# Altium schematic symbol library Capacitor - Aluminium TH.SchLib: 4591 symbols (part 13 of 27) (continued)
## ELZA160ELL222MK20S (continued)
CAP ALUM 2200UF 20% 16V RADIAL; Part Number: ELZA160ELL222MK20S; Manufacturer: United Chemi-Con; TemperatureRange: -55C ~ 105C; Type: Polar; Ripple Current: 1.418A @ 120Hz; Impedance: 29 mOhm; Value: 2200uF; PartId: 23072; Supplier 1: Digi-Key; Supplier Part Number 1: 565-3368-ND; ComponentLink1Description: Datasheet; ComponentLink1URL: http://www.chemi-con.co.jp/cgi-bin/CAT_DB/SEARCH/cat_db_al.cgi?e=e&j=p&pdfname=lza; ComponentLink2Description: Digi-Key Listing; ComponentLink2URL: https://www.digikey.com/product-detail/en/united-chemi-con/ELZA160ELL222MK20S/565-3368-ND/3529537; Tolerance: 20%; Voltage: 16V; Price: 0; Device Package: Radial, Can, 12.5mm
footprint CAP AL TH D12.5 L5 H21.5
pins: 1, 2

## ELZA160ELL332MK25S
designator C?, comment 3300uF  (value not drawn)
CAP ALUM 3300UF 20% 16V RADIAL; Part Number: ELZA160ELL332MK25S; Manufacturer: United Chemi-Con; TemperatureRange: -55C ~ 105C; Type: Polar; Ripple Current: 1.763A @ 120Hz; Impedance: 22 mOhm; Value: 3300uF; PartId: 23742; Supplier 1: Digi-Key; Supplier Part Number 1: 565-3610-ND; ComponentLink1Description: Datasheet; ComponentLink1URL: http://www.chemi-con.co.jp/cgi-bin/CAT_DB/SEARCH/cat_db_al.cgi?e=e&j=p&pdfname=lza; ComponentLink2Description: Digi-Key Listing; ComponentLink2URL: https://www.digikey.com/product-detail/en/united-chemi-con/ELZA160ELL332MK25S/565-3610-ND/3529411; Tolerance: 20%; Voltage: 16V; Price: 1.6; Device Package: Radial, Can, 12.5mm
footprint CAP AL TH D12.5 L5 H26.5
pins: 1, 2

## ELZA250ELL122MJ25S
designator C?, comment 1200uF  (value not drawn)
CAP ALUM 1200UF 20% 25V RADIAL; Part Number: ELZA250ELL122MJ25S; Manufacturer: United Chemi-Con; TemperatureRange: -55C ~ 105C; Type: Polar; Ripple Current: 1.044A @ 120Hz; Impedance: 33 mOhm; Value: 1200uF; PartId: 26203; Supplier 1: Digi-Key; Supplier Part Number 1: 565-3369-ND; ComponentLink1Description: Datasheet; ComponentLink1URL: http://www.chemi-con.co.jp/cgi-bin/CAT_DB/SEARCH/cat_db_al.cgi?e=e&j=p&pdfname=lza; ComponentLink2Description: Digi-Key Listing; ComponentLink2URL: https://www.digikey.com/product-detail/en/united-chemi-con/ELZA250ELL122MJ25S/565-3369-ND/3529540; Tolerance: 20%; Voltage: 25V; Price: 1.78; Device Package: Radial, Can, 10mm
footprint CAP AL TH D10 L5 H30
pins: 1, 2

## ELZA250ELL222MK25S
designator C?, comment 2200uF  (value not drawn)
CAP ALUM 2200UF 20% 25V RADIAL; Part Number: ELZA250ELL222MK25S; Manufacturer: United Chemi-Con; TemperatureRange: -55C ~ 105C; Type: Polar; Ripple Current: 1.763A @ 120Hz; Impedance: 22 mOhm; Value: 2200uF; PartId: 23744; Supplier 1: Digi-Key; Supplier Part Number 1: 565-3611-ND; ComponentLink1Description: Datasheet; ComponentLink1URL: http://www.chemi-con.co.jp/cgi-bin/CAT_DB/SEARCH/cat_db_al.cgi?e=e&j=p&pdfname=lza; ComponentLink2Description: Digi-Key Listing; ComponentLink2URL: https://www.digikey.com/product-detail/en/united-chemi-con/ELZA250ELL222MK25S/565-3611-ND/3529412; Tolerance: 20%; Voltage: 25V; Price: 1.62; Device Package: Radial, Can, 12.5mm
footprint CAP AL TH D12.5 L5 H26.5
pins: 1, 2

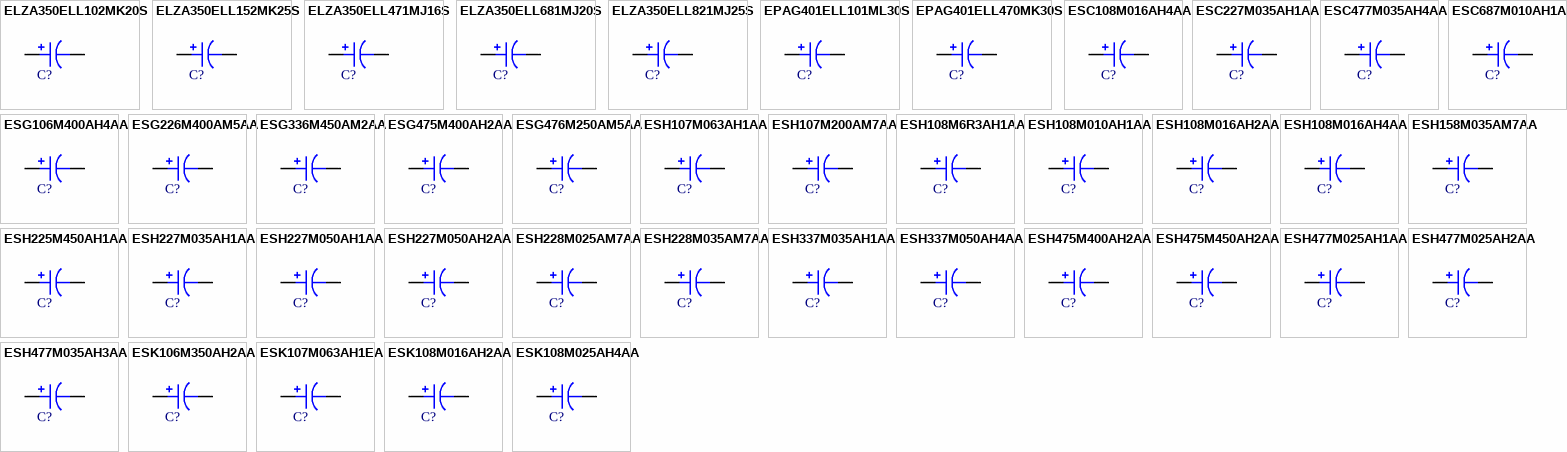
[diagram p53: symbols ELZA350ELL102MK20S to ESK108M025AH4AA]

## ELZA350ELL102MK20S
designator C?, comment 1000uF  (value not drawn)
CAP ALUM 1000UF 20% 35V RADIAL; Part Number: ELZA350ELL102MK20S; Manufacturer: United Chemi-Con; TemperatureRange: -55C ~ 105C; Type: Polar; Ripple Current: 1.134A @ 120Hz; Impedance: 29 mOhm; Value: 1000uF; PartId: 23075; Supplier 1: Digi-Key; Supplier Part Number 1: 565-3373-ND; ComponentLink1Description: Datasheet; ComponentLink1URL: http://www.chemi-con.co.jp/cgi-bin/CAT_DB/SEARCH/cat_db_al.cgi?e=e&j=p&pdfname=lza; ComponentLink2Description: Digi-Key Listing; ComponentLink2URL: https://www.digikey.com/product-detail/en/united-chemi-con/ELZA350ELL102MK20S/565-3373-ND/3529544; Tolerance: 20%; Voltage: 35V; Price: 0; Device Package: Radial, Can, 12.5mm
footprint CAP AL TH D12.5 L5 H21.5
pins: 1, 2

## ELZA350ELL152MK25S
designator C?, comment 1500uF  (value not drawn)
CAP ALUM 1500UF 20% 35V RADIAL; Part Number: ELZA350ELL152MK25S; Manufacturer: United Chemi-Con; TemperatureRange: -55C ~ 105C; Type: Polar; Ripple Current: 1.41A @ 120Hz; Impedance: 22 mOhm; Value: 1500uF; PartId: 23775; Supplier 1: Digi-Key; Supplier Part Number 1: 565-3374-ND; ComponentLink1Description: Datasheet; ComponentLink1URL: http://www.chemi-con.co.jp/cgi-bin/CAT_DB/SEARCH/cat_db_al.cgi?e=e&j=p&pdfname=lza; ComponentLink2Description: Digi-Key Listing; ComponentLink2URL: https://www.digikey.com/product-detail/en/united-chemi-con/ELZA350ELL152MK25S/565-3374-ND/3641511; Tolerance: 20%; Voltage: 35V; Price: 2.25; Device Package: Radial, Can, 12.5mm
footprint CAP AL TH D12.5 L5 H26.5
pins: 1, 2

## ELZA350ELL471MJ16S
designator C?, comment 470uF  (value not drawn)
CAP ALUM 470UF 20% 35V RADIAL; Part Number: ELZA350ELL471MJ16S; Manufacturer: United Chemi-Con; TemperatureRange: -55C ~ 105C; Type: Polar; Ripple Current: 620mA @ 120Hz; Impedance: 49 mOhm; Value: 470uF; PartId: 25438; Supplier 1: Digi-Key; Supplier Part Number 1: 565-3371-ND; ComponentLink1Description: Datasheet; ComponentLink1URL: http://www.chemi-con.co.jp/cgi-bin/CAT_DB/SEARCH/cat_db_al.cgi?e=e&j=p&pdfname=lza; ComponentLink2Description: Digi-Key Listing; ComponentLink2URL: https://www.digikey.com/product-detail/en/united-chemi-con/ELZA350ELL471MJ16S/565-3371-ND/3529547; Tolerance: 20%; Voltage: 35V; Price: 1.36; Device Package: Radial, Can, 10mm
footprint CAP AL TH D10 L5 H17.5
pins: 1, 2

## ELZA350ELL681MJ20S
designator C?, comment 680uF  (value not drawn)
CAP ALUM 680UF 20% 35V RADIAL; Part Number: ELZA350ELL681MJ20S; Manufacturer: United Chemi-Con; TemperatureRange: -55C ~ 105C; Type: Polar; Ripple Current: 930mA @ 120Hz; Impedance: 35 mOhm; Value: 680uF; PartId: 25720; Supplier 1: Digi-Key; Supplier Part Number 1: 565-3372-ND; ComponentLink1Description: Datasheet; ComponentLink1URL: http://www.chemi-con.co.jp/cgi-bin/CAT_DB/SEARCH/cat_db_al.cgi?e=e&j=p&pdfname=lza; ComponentLink2Description: Digi-Key Listing; ComponentLink2URL: https://www.digikey.com/product-detail/en/united-chemi-con/ELZA350ELL681MJ20S/565-3372-ND/3529548; Tolerance: 20%; Voltage: 35V; Price: 1.57; Device Package: Radial, Can, 10mm
footprint CAP AL TH D10 L5 H22
pins: 1, 2

## ELZA350ELL821MJ25S
designator C?, comment 820uF  (value not drawn)
CAP ALUM 820UF 20% 35V RADIAL; Part Number: ELZA350ELL821MJ25S; Manufacturer: United Chemi-Con; TemperatureRange: -55C ~ 105C; Type: Polar; Ripple Current: 1.044A @ 120Hz; Impedance: 33 mOhm; Value: 820uF; PartId: 26190; Supplier 1: Digi-Key; Supplier Part Number 1: 565-3612-ND; ComponentLink1Description: Datasheet; ComponentLink1URL: http://www.chemi-con.co.jp/cgi-bin/CAT_DB/SEARCH/cat_db_al.cgi?e=e&j=p&pdfname=lza; ComponentLink2Description: Digi-Key Listing; ComponentLink2URL: https://www.digikey.com/product-detail/en/united-chemi-con/ELZA350ELL821MJ25S/565-3612-ND/3529413; Tolerance: 20%; Voltage: 35V; Price: 1.17; Device Package: Radial, Can, 10mm
footprint CAP AL TH D10 L5 H30
pins: 1, 2

## EPAG401ELL101ML30S
designator C?, comment 100uF  (value not drawn)
CAP ALUM 100UF 20% 400V RADIAL; Part Number: EPAG401ELL101ML30S; Manufacturer: United Chemi-Con; TemperatureRange: -40C ~ 105C; Type: Polar; Ripple Current: 580mA @ 120Hz; Value: 100uF; PartId: 27277; Supplier 1: Digi-Key; Supplier Part Number 1: 565-4246-ND; ComponentLink1Description: Datasheet; ComponentLink1URL: http://www.chemi-con.co.jp/cgi-bin/CAT_DB/SEARCH/cat_db_al.cgi?e=e&j=p&pdfname=pag; ComponentLink2Description: Digi-Key Listing; ComponentLink2URL: https://www.digikey.com/product-detail/en/united-chemi-con/EPAG401ELL101ML30S/565-4246-ND/3983320; Tolerance: 20%; Voltage: 400V; Price: 3.13; Device Package: Radial, Can, 16mm
footprint CAP AL TH D16 L7.5 H33.5
pins: 1, 2

## EPAG401ELL470MK30S
designator C?, comment 47uF  (value not drawn)
CAP ALUM 47UF 20% 400V RADIAL; Part Number: EPAG401ELL470MK30S; Manufacturer: United Chemi-Con; TemperatureRange: -40C ~ 105C; Type: Polar; Ripple Current: 370mA @ 120Hz; Value: 47uF; PartId: 24408; Supplier 1: Digi-Key; Supplier Part Number 1: 565-4247-ND; ComponentLink1Description: Datasheet; ComponentLink1URL: http://www.chemi-con.co.jp/cgi-bin/CAT_DB/SEARCH/cat_db_al.cgi?e=e&j=p&pdfname=pag; ComponentLink2Description: Digi-Key Listing; ComponentLink2URL: https://www.digikey.com/product-detail/en/united-chemi-con/EPAG401ELL470MK30S/565-4247-ND/3983314; Tolerance: 20%; Voltage: 400V; Price: 1.99; Device Package: Radial, Can, 12.5mm
footprint CAP AL TH D12.5 L5 H35.5
pins: 1, 2

## ESC108M016AH4AA
designator C?, comment 1000uF  (value not drawn)
CAP ALUM 1000UF 20% 16V RADIAL; Part Number: ESC108M016AH4AA; Manufacturer: KEMET; TemperatureRange: -40C ~ 105C; Type: Polar; Ripple Current: 1A @ 120Hz; Impedance: 39 mOhm; Value: 1000uF; PartId: 25500; Supplier 1: Digi-Key; Supplier Part Number 1: 399-6082-ND; ComponentLink1Description: Datasheet; ComponentLink1URL: http://capacitoredge.kemet.com/capedge2/DataSheet?pn=ESC108M016AH4AA; ComponentLink2Description: Digi-Key Listing; ComponentLink2URL: https://www.digikey.com/product-detail/en/kemet/ESC108M016AH4AA/399-6082-ND/2712502; Tolerance: 20%; Voltage: 16V; Price: 0.47; Device Package: Radial, Can, 10mm
footprint CAP AL TH D10 L5 H22
pins: 1, 2

## ESC227M035AH1AA
designator C?, comment 220uF  (value not drawn)
CAP ALUM 220UF 20% 35V RADIAL; Part Number: ESC227M035AH1AA; Manufacturer: KEMET; TemperatureRange: -40C ~ 105C; Type: Polar; Ripple Current: 560mA @ 120Hz; Impedance: 69 mOhm; Value: 220uF; PartId: 24683; Supplier 1: Digi-Key; Supplier Part Number 1: 399-6083-ND; ComponentLink1Description: Datasheet; ComponentLink1URL: http://capacitoredge.kemet.com/capedge2/DataSheet?pn=ESC227M035AH1AA; ComponentLink2Description: Digi-Key Listing; ComponentLink2URL: https://www.digikey.com/product-detail/en/kemet/ESC227M035AH1AA/399-6083-ND/2712550; Tolerance: 20%; Voltage: 35V; Price: 0.34; Device Package: Radial, Can, 10mm
footprint CAP AL TH D10 L5 H14.5
pins: 1, 2

## ESC477M035AH4AA
designator C?, comment 470uF  (value not drawn)
CAP ALUM 470UF 20% 35V RADIAL; Part Number: ESC477M035AH4AA; Manufacturer: KEMET; TemperatureRange: -40C ~ 105C; Type: Polar; Ripple Current: 1.04A @ 120Hz; Impedance: 39 mOhm; Value: 470uF; PartId: 25497; Supplier 1: Digi-Key; Supplier Part Number 1: 399-6086-ND; ComponentLink1Description: Datasheet; ComponentLink1URL: http://capacitoredge.kemet.com/capedge2/DataSheet?pn=ESC477M035AH4AA; ComponentLink2Description: Digi-Key Listing; ComponentLink2URL: https://www.digikey.com/product-detail/en/kemet/ESC477M035AH4AA/399-6086-ND/2712516; Tolerance: 20%; Voltage: 35V; Price: 0.44; Device Package: Radial, Can, 10mm
footprint CAP AL TH D10 L5 H22
pins: 1, 2

## ESC687M010AH1AA
designator C?, comment 680uF  (value not drawn)
CAP ALUM 680UF 20% 10V RADIAL; Part Number: ESC687M010AH1AA; Manufacturer: KEMET; TemperatureRange: -40C ~ 105C; Type: Polar; Ripple Current: 640mA @ 120Hz; Impedance: 85 mOhm; Value: 680uF; PartId: 24704; Supplier 1: Digi-Key; Supplier Part Number 1: 399-6088-ND; ComponentLink1Description: Datasheet; ComponentLink1URL: http://capacitoredge.kemet.com/capedge2/DataSheet?pn=ESC687M010AH1AA; ComponentLink2Description: Digi-Key Listing; ComponentLink2URL: https://www.digikey.com/product-detail/en/kemet/ESC687M010AH1AA/399-6088-ND/2712518; Tolerance: 20%; Voltage: 10V; Price: 0.38; Device Package: Radial, Can, 10mm
footprint CAP AL TH D10 L5 H14.5
pins: 1, 2

## ESG106M400AH4AA
designator C?, comment 10uF  (value not drawn)
CAP ALUM 10UF 20% 400V RADIAL; Part Number: ESG106M400AH4AA; Manufacturer: KEMET; TemperatureRange: -40C ~ 105C; Type: Polar; Ripple Current: 100mA @ 120Hz; Impedance: 2.9 Ohm; Value: 10uF; PartId: 25554; Supplier 1: Digi-Key; Supplier Part Number 1: 399-6538-ND; ComponentLink1Description: Datasheet; ComponentLink1URL: http://www.kemet.com/docfinder?Partnumber=ESG106M400AH4AA; ComponentLink2Description: Digi-Key Listing; ComponentLink2URL: https://www.digikey.com/product-detail/en/kemet/ESG106M400AH4AA/399-6538-ND/3082953; Tolerance: 20%; Voltage: 400V; Price: 0.64; Device Package: Radial, Can, 10mm
footprint CAP AL TH D10 L5 H22
pins: 1, 2

## ESG226M400AM5AA
designator C?, comment 22uF  (value not drawn)
CAP ALUM 22UF 20% 400V RADIAL; Part Number: ESG226M400AM5AA; Manufacturer: KEMET; TemperatureRange: -40C ~ 105C; Type: Polar; Ripple Current: 200mA @ 120Hz; Impedance: 1 Ohm; Value: 22uF; PartId: 26406; Supplier 1: Digi-Key; Supplier Part Number 1: 399-6539-ND; ComponentLink1Description: Datasheet; ComponentLink1URL: http://www.kemet.com/docfinder?Partnumber=ESG226M400AM5AA; ComponentLink2Description: Digi-Key Listing; ComponentLink2URL: https://www.digikey.com/product-detail/en/kemet/ESG226M400AM5AA/399-6539-ND/3082954; Tolerance: 20%; Voltage: 400V; Price: 1; Device Package: Radial, Can, 16mm
footprint CAP AL TH D16 L7.5 H22
pins: 1, 2

## ESG336M450AM2AA
designator C?, comment 33uF  (value not drawn)
CAP ALUM 33UF 20% 450V RADIAL; Part Number: ESG336M450AM2AA; Manufacturer: KEMET; TemperatureRange: -25C ~ 105C; Type: Polar; Ripple Current: 275mA @ 120Hz; Impedance: 1.3 Ohm; Value: 33uF; PartId: 27335; Supplier 1: Digi-Key; Supplier Part Number 1: 399-6540-ND; ComponentLink1Description: Datasheet; ComponentLink1URL: http://www.kemet.com/docfinder?Partnumber=ESG336M450AM2AA; ComponentLink2Description: Digi-Key Listing; ComponentLink2URL: https://www.digikey.com/product-detail/en/kemet/ESG336M450AM2AA/399-6540-ND/3082955; Tolerance: 20%; Voltage: 450V; Price: 1.64; Device Package: Radial, Can, 16mm
footprint CAP AL TH D16 L7.5 H37
pins: 1, 2

## ESG475M400AH2AA
designator C?, comment 4.7uF  (value not drawn)
CAP ALUM 4.7UF 20% 400V RADIAL; Part Number: ESG475M400AH2AA; Manufacturer: KEMET; TemperatureRange: -40C ~ 105C; Type: Polar; Ripple Current: 50mA @ 120Hz; Impedance: 3.5 Ohm; Value: 4.7uF; PartId: 25255; Supplier 1: Digi-Key; Supplier Part Number 1: 399-6091-ND; ComponentLink1Description: Datasheet; ComponentLink1URL: http://capacitoredge.kemet.com/capedge2/DataSheet?pn=ESG475M400AH2AA; ComponentLink2Description: Digi-Key Listing; ComponentLink2URL: https://www.digikey.com/product-detail/en/kemet/ESG475M400AH2AA/399-6091-ND/2712521; Tolerance: 20%; Voltage: 400V; Price: 0.59; Device Package: Radial, Can, 10mm
footprint CAP AL TH D10 L5 H17.5
pins: 1, 2

## ESG476M250AM5AA
designator C?, comment 47uF  (value not drawn)
CAP ALUM 47UF 20% 250V RADIAL; Part Number: ESG476M250AM5AA; Manufacturer: KEMET; TemperatureRange: -40C ~ 105C; Type: Polar; Ripple Current: 275mA @ 120Hz; Impedance: 1.5 Ohm; Value: 47uF; PartId: 26408; Supplier 1: Digi-Key; Supplier Part Number 1: 399-6092-ND; ComponentLink1Description: Datasheet; ComponentLink1URL: http://capacitoredge.kemet.com/capedge2/DataSheet?pn=ESG476M250AM5AA; ComponentLink2Description: Digi-Key Listing; ComponentLink2URL: https://www.digikey.com/product-detail/en/kemet/ESG476M250AM5AA/399-6092-ND/2712522; Tolerance: 20%; Voltage: 250V; Price: 1.02; Device Package: Radial, Can, 16mm
footprint CAP AL TH D16 L7.5 H22
pins: 1, 2

## ESH107M063AH1AA
designator C?, comment 100uF  (value not drawn)
CAP ALUM 100UF 20% 63V RADIAL; Part Number: ESH107M063AH1AA; Manufacturer: KEMET; TemperatureRange: -40C ~ 105C; Type: Polar; Ripple Current: 260mA @ 120Hz; Value: 100uF; PartId: 24745; Supplier 1: Digi-Key; Supplier Part Number 1: 399-6550-ND; ComponentLink1Description: Datasheet; ComponentLink1URL: http://www.kemet.com/docfinder?Partnumber=ESH107M063AH1AA; ComponentLink2Description: Digi-Key Listing; ComponentLink2URL: https://www.digikey.com/product-detail/en/kemet/ESH107M063AH1AA/399-6550-ND/3082965; Tolerance: 20%; Voltage: 63V; Price: 0.42; Device Package: Radial, Can, 10mm
footprint CAP AL TH D10 L5 H14.5
pins: 1, 2

## ESH107M200AM7AA
designator C?, comment 100uF  (value not drawn)
CAP ALUM 100UF 20% 200V RADIAL; Part Number: ESH107M200AM7AA; Manufacturer: KEMET; TemperatureRange: -25C ~ 105C; Type: Polar; Value: 100uF; PartId: 26841; Supplier 1: Digi-Key; Supplier Part Number 1: 399-6551-ND; ComponentLink1Description: Datasheet; ComponentLink1URL: http://www.kemet.com/docfinder?Partnumber=ESH107M200AM7AA; ComponentLink2Description: Digi-Key Listing; ComponentLink2URL: https://www.digikey.com/product-detail/en/kemet/ESH107M200AM7AA/399-6551-ND/3082966; Tolerance: 20%; Voltage: 200V; Price: 1.02; Device Package: Radial, Can, 16mm
footprint CAP AL TH D16 L7.5 H27
pins: 1, 2

## ESH108M6R3AH1AA
designator C?, comment 1000uF  (value not drawn)
CAP ALUM 1000UF 20% 6.3V RADIAL; Part Number: ESH108M6R3AH1AA; Manufacturer: KEMET; TemperatureRange: -40C ~ 105C; Type: Polar; Ripple Current: 470mA @ 120Hz; Value: 1000uF; PartId: 24676; Supplier 1: Digi-Key; Supplier Part Number 1: 399-6558-ND; ComponentLink1Description: Datasheet; ComponentLink1URL: http://www.kemet.com/docfinder?Partnumber=ESH108M6R3AH1AA; ComponentLink2Description: Digi-Key Listing; ComponentLink2URL: https://www.digikey.com/product-detail/en/kemet/ESH108M6R3AH1AA/399-6558-ND/3082973; Tolerance: 20%; Voltage: 6.3V; Price: 0.32; Device Package: Radial, Can, 10mm
footprint CAP AL TH D10 L5 H14.5
pins: 1, 2

## ESH108M010AH1AA
designator C?, comment 1000uF  (value not drawn)
CAP ALUM 1000UF 20% 10V RADIAL; Part Number: ESH108M010AH1AA; Manufacturer: KEMET; TemperatureRange: -40C ~ 105C; Type: Polar; Value: 1000uF; PartId: 24751; Supplier 1: Digi-Key; Supplier Part Number 1: 399-6552-ND; ComponentLink1Description: Datasheet; ComponentLink1URL: http://www.kemet.com/docfinder?Partnumber=ESH108M010AH1AA; ComponentLink2Description: Digi-Key Listing; ComponentLink2URL: https://www.digikey.com/product-detail/en/kemet/ESH108M010AH1AA/399-6552-ND/3082967; Tolerance: 20%; Voltage: 10V; Price: 0.42; Device Package: Radial, Can, 10mm
footprint CAP AL TH D10 L5 H14.5
pins: 1, 2

## ESH108M016AH2AA
designator C?, comment 1000uF  (value not drawn)
CAP ALUM 1000UF 20% 16V RADIAL; Part Number: ESH108M016AH2AA; Manufacturer: KEMET; TemperatureRange: -40C ~ 105C; Type: Polar; Value: 1000uF; PartId: 25173; Supplier 1: Digi-Key; Supplier Part Number 1: 399-6553-ND; ComponentLink1Description: Datasheet; ComponentLink1URL: http://www.kemet.com/docfinder?Partnumber=ESH108M016AH2AA; ComponentLink2Description: Digi-Key Listing; ComponentLink2URL: https://www.digikey.com/product-detail/en/kemet/ESH108M016AH2AA/399-6553-ND/3082968; Tolerance: 20%; Voltage: 16V; Price: 0.45; Device Package: Radial, Can, 10mm
footprint CAP AL TH D10 L5 H17.5
pins: 1, 2

## ESH108M016AH4AA
designator C?, comment 1000uF  (value not drawn)
CAP ALUM 1000UF 20% 16V RADIAL; Part Number: ESH108M016AH4AA; Manufacturer: KEMET; TemperatureRange: -40C ~ 105C; Type: Polar; Ripple Current: 700mA @ 120Hz; Value: 1000uF; PartId: 25501; Supplier 1: Digi-Key; Supplier Part Number 1: 399-6554-ND; ComponentLink1Description: Datasheet; ComponentLink1URL: http://www.kemet.com/docfinder?Partnumber=ESH108M016AH4AA; ComponentLink2Description: Digi-Key Listing; ComponentLink2URL: https://www.digikey.com/product-detail/en/kemet/ESH108M016AH4AA/399-6554-ND/3082969; Tolerance: 20%; Voltage: 16V; Price: 0.47; Device Package: Radial, Can, 10mm
footprint CAP AL TH D10 L5 H22
pins: 1, 2

## ESH158M035AM7AA
designator C?, comment 1500uF  (value not drawn)
CAP ALUM 1500UF 20% 35V RADIAL; Part Number: ESH158M035AM7AA; Manufacturer: KEMET; TemperatureRange: -40C ~ 105C; Type: Polar; Ripple Current: 1.11A @ 120Hz; Value: 1500uF; PartId: 26805; Supplier 1: Digi-Key; Supplier Part Number 1: 399-6559-ND; ComponentLink1Description: Datasheet; ComponentLink1URL: http://www.kemet.com/docfinder?Partnumber=ESH158M035AM7AA; ComponentLink2Description: Digi-Key Listing; ComponentLink2URL: https://www.digikey.com/product-detail/en/kemet/ESH158M035AM7AA/399-6559-ND/3082974; Tolerance: 20%; Voltage: 35V; Price: 0.83; Device Package: Radial, Can, 16mm
footprint CAP AL TH D16 L7.5 H27
pins: 1, 2

## ESH225M450AH1AA
designator C?, comment 2.2uF  (value not drawn)
CAP ALUM 2.2UF 20% 450V RADIAL; Part Number: ESH225M450AH1AA; Manufacturer: KEMET; TemperatureRange: -25C ~ 105C; Type: Polar; Ripple Current: 37mA @ 120Hz; Value: 2.2uF; PartId: 24710; Supplier 1: Digi-Key; Supplier Part Number 1: 399-6561-ND; ComponentLink1Description: Datasheet; ComponentLink1URL: http://www.kemet.com/docfinder?Partnumber=ESH225M450AH1AA; ComponentLink2Description: Digi-Key Listing; ComponentLink2URL: https://www.digikey.com/product-detail/en/kemet/ESH225M450AH1AA/399-6561-ND/3082976; Tolerance: 20%; Voltage: 450V; Price: 0.39; Device Package: Radial, Can, 10mm
footprint CAP AL TH D10 L5 H14.5
pins: 1, 2

## ESH227M035AH1AA
designator C?, comment 220uF  (value not drawn)
CAP ALUM 220UF 20% 35V RADIAL; Part Number: ESH227M035AH1AA; Manufacturer: KEMET; TemperatureRange: -40C ~ 105C; Type: Polar; Ripple Current: 315mA @ 120Hz; Value: 220uF; PartId: 24690; Supplier 1: Digi-Key; Supplier Part Number 1: 399-6568-ND; ComponentLink1Description: Datasheet; ComponentLink1URL: http://www.kemet.com/docfinder?Partnumber=ESH227M035AH1AA; ComponentLink2Description: Digi-Key Listing; ComponentLink2URL: https://www.digikey.com/product-detail/en/kemet/ESH227M035AH1AA/399-6568-ND/3082983; Tolerance: 20%; Voltage: 35V; Price: 0.35; Device Package: Radial, Can, 10mm
footprint CAP AL TH D10 L5 H14.5
pins: 1, 2

## ESH227M050AH1AA
designator C?, comment 220uF  (value not drawn)
CAP ALUM 220UF 20% 50V RADIAL; Part Number: ESH227M050AH1AA; Manufacturer: KEMET; TemperatureRange: -40C ~ 105C; Type: Polar; Value: 220uF; PartId: 24847; Supplier 1: Digi-Key; Supplier Part Number 1: 399-6569-ND; ComponentLink1Description: Datasheet; ComponentLink1URL: http://www.kemet.com/docfinder?Partnumber=ESH227M050AH1AA; ComponentLink2Description: Digi-Key Listing; ComponentLink2URL: https://www.digikey.com/product-detail/en/kemet/ESH227M050AH1AA/399-6569-ND/3082984; Tolerance: 20%; Voltage: 50V; Price: 0.47; Device Package: Radial, Can, 10mm
footprint CAP AL TH D10 L5 H14.5
pins: 1, 2

## ESH227M050AH2AA
designator C?, comment 220uF  (value not drawn)
CAP ALUM 220UF 20% 50V RADIAL; Part Number: ESH227M050AH2AA; Manufacturer: KEMET; TemperatureRange: -40C ~ 105C; Type: Polar; Ripple Current: 400mA @ 120Hz; Value: 220uF; PartId: 25155; Supplier 1: Digi-Key; Supplier Part Number 1: 399-6570-ND; ComponentLink1Description: Datasheet; ComponentLink1URL: http://www.kemet.com/docfinder?Partnumber=ESH227M050AH2AA; ComponentLink2Description: Digi-Key Listing; ComponentLink2URL: https://www.digikey.com/product-detail/en/kemet/ESH227M050AH2AA/399-6570-ND/3082985; Tolerance: 20%; Voltage: 50V; Price: 0.43; Device Package: Radial, Can, 10mm
footprint CAP AL TH D10 L5 H17.5
pins: 1, 2

## ESH228M025AM7AA
designator C?, comment 2200uF  (value not drawn)
CAP ALUM 2200UF 20% 25V RADIAL; Part Number: ESH228M025AM7AA; Manufacturer: KEMET; TemperatureRange: -40C ~ 105C; Type: Polar; Ripple Current: 1.23A @ 120Hz; Value: 2200uF; PartId: 26807; Supplier 1: Digi-Key; Supplier Part Number 1: 399-6571-ND; ComponentLink1Description: Datasheet; ComponentLink1URL: http://www.kemet.com/docfinder?Partnumber=ESH228M025AM7AA; ComponentLink2Description: Digi-Key Listing; ComponentLink2URL: https://www.digikey.com/product-detail/en/kemet/ESH228M025AM7AA/399-6571-ND/3082986; Tolerance: 20%; Voltage: 25V; Price: 0.84; Device Package: Radial, Can, 16mm
footprint CAP AL TH D16 L7.5 H27
pins: 1, 2

## ESH228M035AM7AA
designator C?, comment 2200uF  (value not drawn)
CAP ALUM 2200UF 20% 35V RADIAL; Part Number: ESH228M035AM7AA; Manufacturer: KEMET; TemperatureRange: -40C ~ 105C; Type: Polar; Value: 2200uF; PartId: 26829; Supplier 1: Digi-Key; Supplier Part Number 1: 399-6572-ND; ComponentLink1Description: Datasheet; ComponentLink1URL: http://www.kemet.com/docfinder?Partnumber=ESH228M035AM7AA; ComponentLink2Description: Digi-Key Listing; ComponentLink2URL: https://www.digikey.com/product-detail/en/kemet/ESH228M035AM7AA/399-6572-ND/3082987; Tolerance: 20%; Voltage: 35V; Price: 0.98; Device Package: Radial, Can, 16mm
footprint CAP AL TH D16 L7.5 H27
pins: 1, 2

## ESH337M035AH1AA
designator C?, comment 330uF  (value not drawn)
CAP ALUM 330UF 20% 35V RADIAL; Part Number: ESH337M035AH1AA; Manufacturer: KEMET; TemperatureRange: -40C ~ 105C; Type: Polar; Value: 330uF; PartId: 24682; Supplier 1: Digi-Key; Supplier Part Number 1: 399-6581-ND; ComponentLink1Description: Datasheet; ComponentLink1URL: http://www.kemet.com/docfinder?Partnumber=ESH337M035AH1AA; ComponentLink2Description: Digi-Key Listing; ComponentLink2URL: https://www.digikey.com/product-detail/en/kemet/ESH337M035AH1AA/399-6581-ND/3082996; Tolerance: 20%; Voltage: 35V; Price: 0.33; Device Package: Radial, Can, 10mm
footprint CAP AL TH D10 L5 H14.5
pins: 1, 2

## ESH337M050AH4AA
designator C?, comment 330uF  (value not drawn)
CAP ALUM 330UF 20% 50V RADIAL; Part Number: ESH337M050AH4AA; Manufacturer: KEMET; TemperatureRange: -40C ~ 105C; Type: Polar; Ripple Current: 535mA @ 120Hz; Value: 330uF; PartId: 25506; Supplier 1: Digi-Key; Supplier Part Number 1: 399-6582-ND; ComponentLink1Description: Datasheet; ComponentLink1URL: http://www.kemet.com/docfinder?Partnumber=ESH337M050AH4AA; ComponentLink2Description: Digi-Key Listing; ComponentLink2URL: https://www.digikey.com/product-detail/en/kemet/ESH337M050AH4AA/399-6582-ND/3082997; Tolerance: 20%; Voltage: 50V; Price: 0.49; Device Package: Radial, Can, 10mm
footprint CAP AL TH D10 L5 H22
pins: 1, 2

## ESH475M400AH2AA
designator C?, comment 4.7uF  (value not drawn)
CAP ALUM 4.7UF 20% 400V RADIAL; Part Number: ESH475M400AH2AA; Manufacturer: KEMET; TemperatureRange: -25C ~ 105C; Type: Polar; Ripple Current: 57mA @ 120Hz; Value: 4.7uF; PartId: 25160; Supplier 1: Digi-Key; Supplier Part Number 1: 399-6097-ND; ComponentLink1Description: Datasheet; ComponentLink1URL: http://capacitoredge.kemet.com/capedge2/DataSheet?pn=ESH475M400AH2AA; ComponentLink2Description: Digi-Key Listing; ComponentLink2URL: https://www.digikey.com/product-detail/en/kemet/ESH475M400AH2AA/399-6097-ND/2712512; Tolerance: 20%; Voltage: 400V; Price: 0.44; Device Package: Radial, Can, 10mm
footprint CAP AL TH D10 L5 H17.5
pins: 1, 2

## ESH475M450AH2AA
designator C?, comment 4.7uF  (value not drawn)
CAP ALUM 4.7UF 20% 450V RADIAL; Part Number: ESH475M450AH2AA; Manufacturer: KEMET; TemperatureRange: -25C ~ 105C; Type: Polar; Ripple Current: 59mA @ 120Hz; Value: 4.7uF; PartId: 25186; Supplier 1: Digi-Key; Supplier Part Number 1: 399-6585-ND; ComponentLink1Description: Datasheet; ComponentLink1URL: http://www.kemet.com/docfinder?Partnumber=ESH475M450AH2AA; ComponentLink2Description: Digi-Key Listing; ComponentLink2URL: https://www.digikey.com/product-detail/en/kemet/ESH475M450AH2AA/399-6585-ND/3083000; Tolerance: 20%; Voltage: 450V; Price: 0.48; Device Package: Radial, Can, 10mm
footprint CAP AL TH D10 L5 H17.5
pins: 1, 2

## ESH477M025AH1AA
designator C?, comment 470uF  (value not drawn)
CAP ALUM 470UF 20% 25V RADIAL; Part Number: ESH477M025AH1AA; Manufacturer: KEMET; TemperatureRange: -40C ~ 105C; Type: Polar; Ripple Current: 405mA @ 120Hz; Value: 470uF; PartId: 24747; Supplier 1: Digi-Key; Supplier Part Number 1: 399-6590-ND; ComponentLink1Description: Datasheet; ComponentLink1URL: http://www.kemet.com/docfinder?Partnumber=ESH477M025AH1AA; ComponentLink2Description: Digi-Key Listing; ComponentLink2URL: https://www.digikey.com/product-detail/en/kemet/ESH477M025AH1AA/399-6590-ND/3083005; Tolerance: 20%; Voltage: 25V; Price: 0.42; Device Package: Radial, Can, 10mm
footprint CAP AL TH D10 L5 H14.5
pins: 1, 2

## ESH477M025AH2AA
designator C?, comment 470uF  (value not drawn)
CAP ALUM 470UF 20% 25V RADIAL; Part Number: ESH477M025AH2AA; Manufacturer: KEMET; TemperatureRange: -40C ~ 105C; Type: Polar; Ripple Current: 470mA @ 120Hz; Value: 470uF; PartId: 25181; Supplier 1: Digi-Key; Supplier Part Number 1: 399-6591-ND; ComponentLink1Description: Datasheet; ComponentLink1URL: http://www.kemet.com/docfinder?Partnumber=ESH477M025AH2AA; ComponentLink2Description: Digi-Key Listing; ComponentLink2URL: https://www.digikey.com/product-detail/en/kemet/ESH477M025AH2AA/399-6591-ND/3083006; Tolerance: 20%; Voltage: 25V; Price: 0.47; Device Package: Radial, Can, 10mm
footprint CAP AL TH D10 L5 H17.5
pins: 1, 2

## ESH477M035AH3AA
designator C?, comment 470uF  (value not drawn)
CAP ALUM 470UF 20% 35V RADIAL; Part Number: ESH477M035AH3AA; Manufacturer: KEMET; TemperatureRange: -40C ~ 105C; Type: Polar; Value: 470uF; PartId: 25490; Supplier 1: Digi-Key; Supplier Part Number 1: 399-6592-ND; ComponentLink1Description: Datasheet; ComponentLink1URL: http://www.kemet.com/docfinder?Partnumber=ESH477M035AH3AA; ComponentLink2Description: Digi-Key Listing; ComponentLink2URL: https://www.digikey.com/product-detail/en/kemet/ESH477M035AH3AA/399-6592-ND/3083007; Tolerance: 20%; Voltage: 35V; Price: 0.42; Device Package: Radial, Can, 10mm
footprint CAP AL TH D10 L5 H22
pins: 1, 2

## ESK106M350AH2AA
designator C?, comment 10uF  (value not drawn)
CAP ALUM 10UF 20% 350V RADIAL; Part Number: ESK106M350AH2AA; Manufacturer: KEMET; TemperatureRange: -25C ~ 85C; Type: Polar; Ripple Current: 70mA @ 120Hz; Value: 10uF; PartId: 25148; Supplier 1: Digi-Key; Supplier Part Number 1: 399-6101-ND; ComponentLink1Description: Datasheet; ComponentLink1URL: http://capacitoredge.kemet.com/capedge2/DataSheet?pn=ESK106M350AH2AA; ComponentLink2Description: Digi-Key Listing; ComponentLink2URL: https://www.digikey.com/product-detail/en/kemet/ESK106M350AH2AA/399-6101-ND/2712503; Tolerance: 20%; Voltage: 350V; Price: 0.42; Device Package: Radial, Can, 10mm
footprint CAP AL TH D10 L5 H17.5
pins: 1, 2

## ESK107M063AH1EA
designator C?, comment 100uF  (value not drawn)
CAP ALUM 100UF 20% 63V RADIAL; Part Number: ESK107M063AH1EA; Manufacturer: KEMET; TemperatureRange: -40C ~ 85C; Type: Polar; Ripple Current: 300mA @ 120Hz; Value: 100uF; PartId: 24493; Supplier 1: Digi-Key; Supplier Part Number 1: 399-6651-3-ND; ComponentLink1Description: Datasheet; ComponentLink1URL: http://www.kemet.com/docfinder?Partnumber=ESK107M063AH1EA; ComponentLink2Description: Digi-Key Listing; ComponentLink2URL: https://www.digikey.com/product-detail/en/kemet/ESK107M063AH1EA/399-6651-3-ND/3083066; Tolerance: 20%; Voltage: 63V; Price: 0.1055; Device Package: Radial, Can, 10mm
footprint CAP AL TH D10 L5 H14.5
pins: 1, 2

## ESK108M016AH2AA
designator C?, comment 1000uF  (value not drawn)
CAP ALUM 1000UF 20% 16V RADIAL; Part Number: ESK108M016AH2AA; Manufacturer: KEMET; TemperatureRange: -40C ~ 85C; Type: Polar; Ripple Current: 630mA @ 120Hz; Value: 1000uF; PartId: 25154; Supplier 1: Digi-Key; Supplier Part Number 1: 399-6106-ND; ComponentLink1Description: Datasheet; ComponentLink1URL: http://capacitoredge.kemet.com/capedge2/DataSheet?pn=ESK108M016AH2AA; ComponentLink2Description: Digi-Key Listing; ComponentLink2URL: https://www.digikey.com/product-detail/en/kemet/ESK108M016AH2AA/399-6106-ND/2712524; Tolerance: 20%; Voltage: 16V; Price: 0.43; Device Package: Radial, Can, 10mm
footprint CAP AL TH D10 L5 H17.5
pins: 1, 2

## ESK108M025AH4AA
designator C?, comment 1000uF  (value not drawn)
CAP ALUM 1000UF 20% 25V RADIAL; Part Number: ESK108M025AH4AA; Manufacturer: KEMET; TemperatureRange: -40C ~ 85C; Type: Polar; Ripple Current: 760mA @ 120Hz; Value: 1000uF; PartId: 25495; Supplier 1: Digi-Key; Supplier Part Number 1: 399-6603-ND; ComponentLink1Description: Datasheet; ComponentLink1URL: http://www.kemet.com/docfinder?Partnumber=ESK108M025AH4AA; ComponentLink2Description: Digi-Key Listing; ComponentLink2URL: https://www.digikey.com/product-detail/en/kemet/ESK108M025AH4AA/399-6603-ND/3083018; Tolerance: 20%; Voltage: 25V; Price: 0.43; Device Package: Radial, Can, 10mm
footprint CAP AL TH D10 L5 H22
pins: 1, 2
